# Altium footprint library IC.PcbLib: 386 footprints (part 5 of 30)
Each footprint in its own frame and in the unit in brackets; x right, y up, seen from the top. Pads: shape width x height; smd on the part's side, far side on the other; paste and mask are expansions set on the pad; w line width, h text height; cw(c..) or ccw(c..) is an arc to the next point about the centre after c.
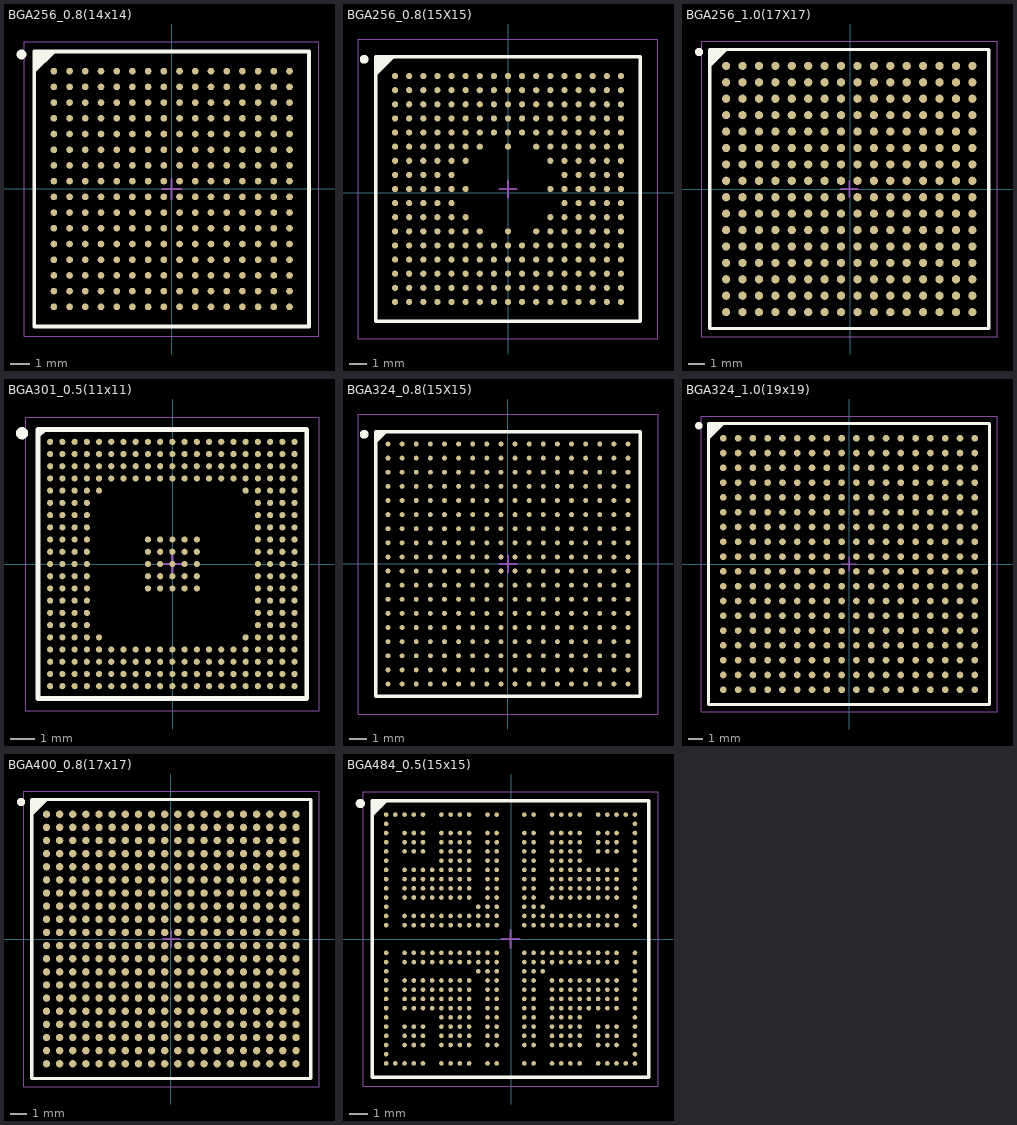
[diagram p4: the footprints below, top view; thin cyan lines are the x and y axes]

## BGA256_0.8(14x14) [mm]
pads (256):
  round 0.34 smd: A1(-6,5.975) A2(-5.2,5.975) A3(-4.4,5.975) A4(-3.6,5.975) A5(-2.8,5.975) A6(-2,5.975) A7(-1.2,5.975) A8(-0.4,5.975) A9(0.4,5.975) A10(1.2,5.975) A11(2,5.975) A12(2.8,5.975) A13(3.6,5.975) A14(4.4,5.975) A15(5.2,5.975) A16(6,5.975) B1(-6,5.175) B2(-5.2,5.175) B3(-4.4,5.175) B4(-3.6,5.175) B5(-2.8,5.175) B6(-2,5.175) B7(-1.2,5.175) B8(-0.4,5.175) B9(0.4,5.175) B10(1.2,5.175) B11(2,5.175) B12(2.8,5.175) B13(3.6,5.175) B14(4.4,5.175) B15(5.2,5.175) B16(6,5.175) C1(-6,4.375) C2(-5.2,4.375) C3(-4.4,4.375) C4(-3.6,4.375) C5(-2.8,4.375) C6(-2,4.375) C7(-1.2,4.375) C8(-0.4,4.375) C9(0.4,4.375) C10(1.2,4.375) C11(2,4.375) C12(2.8,4.375) C13(3.6,4.375) C14(4.4,4.375) C15(5.2,4.375) C16(6,4.375) D1(-6,3.575) D2(-5.2,3.575) D3(-4.4,3.575) D4(-3.6,3.575) D5(-2.8,3.575) D6(-2,3.575) D7(-1.2,3.575) D8(-0.4,3.575) D9(0.4,3.575) D10(1.2,3.575) D11(2,3.575) D12(2.8,3.575) D13(3.6,3.575) D14(4.4,3.575) D15(5.2,3.575) D16(6,3.575) E1(-6,2.775) E2(-5.2,2.775) E3(-4.4,2.775) E4(-3.6,2.775) E5(-2.8,2.775) E6(-2,2.775) E7(-1.2,2.775) E8(-0.4,2.775) E9(0.4,2.775) E10(1.2,2.775) E11(2,2.775) E12(2.8,2.775) E13(3.6,2.775) E14(4.4,2.775) E15(5.2,2.775) E16(6,2.775) F1(-6,1.975) F2(-5.2,1.975) F3(-4.4,1.975) F4(-3.6,1.975) F5(-2.8,1.975) F6(-2,1.975) F7(-1.2,1.975) F8(-0.4,1.975) F9(0.4,1.975) F10(1.2,1.975) F11(2,1.975) F12(2.8,1.975) F13(3.6,1.975) F14(4.4,1.975) F15(5.2,1.975) F16(6,1.975) G1(-6,1.175) G2(-5.2,1.175) G3(-4.4,1.175) G4(-3.6,1.175) G5(-2.8,1.175) G6(-2,1.175) G7(-1.2,1.175) G8(-0.4,1.175) G9(0.4,1.175) G10(1.2,1.175) G11(2,1.175) G12(2.8,1.175) G13(3.6,1.175) G14(4.4,1.175) G15(5.2,1.175) G16(6,1.175) H1(-6,0.375) H2(-5.2,0.375) H3(-4.4,0.375) H4(-3.6,0.375) H5(-2.8,0.375) H6(-2,0.375) H7(-1.2,0.375) H8(-0.4,0.375) H9(0.4,0.375) H10(1.2,0.375) H11(2,0.375) H12(2.8,0.375) H13(3.6,0.375) H14(4.4,0.375) H15(5.2,0.375) H16(6,0.375) J1(-6,-0.425) J2(-5.2,-0.425) J3(-4.4,-0.425) J4(-3.6,-0.425) J5(-2.8,-0.425) J6(-2,-0.425) J7(-1.2,-0.425) J8(-0.4,-0.425) J9(0.4,-0.425) J10(1.2,-0.425) J11(2,-0.425) J12(2.8,-0.425) J13(3.6,-0.425) J14(4.4,-0.425) J15(5.2,-0.425) J16(6,-0.425) K1(-6,-1.225) K2(-5.2,-1.225) K3(-4.4,-1.225) K4(-3.6,-1.225) K5(-2.8,-1.225) K6(-2,-1.225) K7(-1.2,-1.225) K8(-0.4,-1.225) K9(0.4,-1.225) K10(1.2,-1.225) K11(2,-1.225) K12(2.8,-1.225) K13(3.6,-1.225) K14(4.4,-1.225) K15(5.2,-1.225) K16(6,-1.225) L1(-6,-2.025) L2(-5.2,-2.025) L3(-4.4,-2.025) L4(-3.6,-2.025) L5(-2.8,-2.025) L6(-2,-2.025) L7(-1.2,-2.025) L8(-0.4,-2.025) L9(0.4,-2.025) L10(1.2,-2.025) L11(2,-2.025) L12(2.8,-2.025) L13(3.6,-2.025) L14(4.4,-2.025) L15(5.2,-2.025) L16(6,-2.025) M1(-6,-2.825) M2(-5.2,-2.825) M3(-4.4,-2.825) M4(-3.6,-2.825) M5(-2.8,-2.825) M6(-2,-2.825) M7(-1.2,-2.825) M8(-0.4,-2.825) M9(0.4,-2.825) M10(1.2,-2.825) M11(2,-2.825) M12(2.8,-2.825) M13(3.6,-2.825) M14(4.4,-2.825) M15(5.2,-2.825) M16(6,-2.825) N1(-6,-3.625) N2(-5.2,-3.625) N3(-4.4,-3.625) N4(-3.6,-3.625) N5(-2.8,-3.625) N6(-2,-3.625) N7(-1.2,-3.625) N8(-0.4,-3.625) N9(0.4,-3.625) N10(1.2,-3.625) N11(2,-3.625) N12(2.8,-3.625) N13(3.6,-3.625) N14(4.4,-3.625) N15(5.2,-3.625) N16(6,-3.625) P1(-6,-4.425) P2(-5.2,-4.425) P3(-4.4,-4.425) P4(-3.6,-4.425) P5(-2.8,-4.425) P6(-2,-4.425) P7(-1.2,-4.425) P8(-0.4,-4.425) P9(0.4,-4.425) P10(1.2,-4.425) P11(2,-4.425) P12(2.8,-4.425) P13(3.6,-4.425) P14(4.4,-4.425) P15(5.2,-4.425) P16(6,-4.425) R1(-6,-5.225) R2(-5.2,-5.225) R3(-4.4,-5.225) R4(-3.6,-5.225) R5(-2.8,-5.225) R6(-2,-5.225) R7(-1.2,-5.225) R8(-0.4,-5.225) R9(0.4,-5.225) R10(1.2,-5.225) R11(2,-5.225) R12(2.8,-5.225) R13(3.6,-5.225) R14(4.4,-5.225) R15(5.2,-5.225) R16(6,-5.225) T1(-6,-6.025) T2(-5.2,-6.025) T3(-4.4,-6.025) T4(-3.6,-6.025) T5(-2.8,-6.025) T6(-2,-6.025) T7(-1.2,-6.025) T8(-0.4,-6.025) T9(0.4,-6.025) T10(1.2,-6.025) T11(2,-6.025) T12(2.8,-6.025) T13(3.6,-6.025) T14(4.4,-6.025) T15(5.2,-6.025) T16(6,-6.025)
Top Overlay:
  circle w0.25: c-7.65,6.825 r0.125
  region: -6,6.975 -7,5.975 -7,6.975
  lines w0.2: -7,5.975 -6,6.975 ; -7,-7.025 -7,6.975 7,6.975 7,-7.025 -7,-7.025
Mechanical 13:
  lines w0.1: -7,-7.025 -7,6.975 7,6.975 7,-7.025 -7,-7.025
Mechanical 15:
  lines w0.05: -7.5,-7.525 -7.5,7.475 7.5,7.475 7.5,-7.525 -7.5,-7.525
  lines w0.1: -0.5,-0.025 0.5,-0.025 ; 0,-0.525 0,0.475
3D body "BGA256C80P16X16_1400X1400X150.step": height 1.5, standoff 0, extent -7,-7 7,7

## BGA256_0.8(15X15) [mm]
pads (256):
  round 0.35 smd: A1(-6.425,6.603) A2(-5.625,6.603) A3(-4.825,6.603) A4(-4.025,6.603) A5(-3.225,6.603) A6(-2.425,6.603) A7(-1.625,6.603) A8(-0.825,6.603) A9(-0.025,6.603) A10(0.775,6.603) A11(1.575,6.603) A12(2.375,6.603) A13(3.175,6.603) A14(3.975,6.603) A15(4.775,6.603) A16(5.575,6.603) A17(6.375,6.603) B1(-6.425,5.803) B2(-5.625,5.803) B3(-4.825,5.803) B4(-4.025,5.803) B5(-3.225,5.803) B6(-2.425,5.803) B7(-1.625,5.803) B8(-0.825,5.803) B9(-0.025,5.803) B10(0.775,5.803) B11(1.575,5.803) B12(2.375,5.803) B13(3.175,5.803) B14(3.975,5.803) B15(4.775,5.803) B16(5.575,5.803) B17(6.375,5.803) C1(-6.425,5.003) C2(-5.625,5.003) C3(-4.825,5.003) C4(-4.025,5.003) C5(-3.225,5.003) C6(-2.425,5.003) C7(-1.625,5.003) C8(-0.825,5.003) C9(-0.025,5.003) C10(0.775,5.003) C11(1.575,5.003) C12(2.375,5.003) C13(3.175,5.003) C14(3.975,5.003) C15(4.775,5.003) C16(5.575,5.003) C17(6.375,5.003) D1(-6.425,4.203) D2(-5.625,4.203) D3(-4.825,4.203) D4(-4.025,4.203) D5(-3.225,4.203) D6(-2.425,4.203) D7(-1.625,4.203) D8(-0.825,4.203) D9(-0.025,4.203) D10(0.775,4.203) D11(1.575,4.203) D12(2.375,4.203) D13(3.175,4.203) D14(3.975,4.203) D15(4.775,4.203) D16(5.575,4.203) D17(6.375,4.203) E1(-6.425,3.403) E2(-5.625,3.403) E3(-4.825,3.403) E4(-4.025,3.403) E5(-3.225,3.403) E6(-2.425,3.403) E7(-1.625,3.403) E8(-0.825,3.403) E9(-0.025,3.403) E10(0.775,3.403) E11(1.575,3.403) E12(2.375,3.403) E13(3.175,3.403) E14(3.975,3.403) E15(4.775,3.403) E16(5.575,3.403) E17(6.375,3.403) F1(-6.425,2.603) F2(-5.625,2.603) F3(-4.825,2.603) F4(-4.025,2.603) F5(-3.225,2.603) F6(-2.425,2.603) F7(-1.625,2.603) F9(-0.025,2.603) F11(1.575,2.603) F12(2.375,2.603) F13(3.175,2.603) F14(3.975,2.603) F15(4.775,2.603) F16(5.575,2.603) F17(6.375,2.603) G1(-6.425,1.803) G2(-5.625,1.803) G3(-4.825,1.803) G4(-4.025,1.803) G5(-3.225,1.803) G6(-2.425,1.803) G12(2.375,1.803) G13(3.175,1.803) G14(3.975,1.803) G15(4.775,1.803) G16(5.575,1.803) G17(6.375,1.803) H1(-6.425,1.003) H2(-5.625,1.003) H3(-4.825,1.003) H4(-4.025,1.003) H5(-3.225,1.003) H13(3.175,1.003) H14(3.975,1.003) H15(4.775,1.003) H16(5.575,1.003) H17(6.375,1.003) J1(-6.425,0.203) J2(-5.625,0.203) J3(-4.825,0.203) J4(-4.025,0.203) J5(-3.225,0.203) J6(-2.425,0.203) J12(2.375,0.203) J13(3.175,0.203) J14(3.975,0.203) J15(4.775,0.203) J16(5.575,0.203) J17(6.375,0.203) K1(-6.425,-0.597) K2(-5.625,-0.597) K3(-4.825,-0.597) K4(-4.025,-0.597) K5(-3.225,-0.597) K13(3.175,-0.597) K14(3.975,-0.597) K15(4.775,-0.597) K16(5.575,-0.597) K17(6.375,-0.597) L1(-6.425,-1.397) L2(-5.625,-1.397) L3(-4.825,-1.397) L4(-4.025,-1.397) L5(-3.225,-1.397) L6(-2.425,-1.397) L12(2.375,-1.397) L13(3.175,-1.397) L14(3.975,-1.397) L15(4.775,-1.397) L16(5.575,-1.397) L17(6.375,-1.397) M1(-6.425,-2.197) M2(-5.625,-2.197) M3(-4.825,-2.197) M4(-4.025,-2.197) M5(-3.225,-2.197) M6(-2.425,-2.197) M7(-1.625,-2.197) M9(-0.025,-2.197) M11(1.575,-2.197) M12(2.375,-2.197) M13(3.175,-2.197) M14(3.975,-2.197) M15(4.775,-2.197) M16(5.575,-2.197) M17(6.375,-2.197) N1(-6.425,-2.997) N2(-5.625,-2.997) N3(-4.825,-2.997) N4(-4.025,-2.997) N5(-3.225,-2.997) N6(-2.425,-2.997) N7(-1.625,-2.997) N8(-0.825,-2.997) N9(-0.025,-2.997) N10(0.775,-2.997) N11(1.575,-2.997) N12(2.375,-2.997) N13(3.175,-2.997) N14(3.975,-2.997) N15(4.775,-2.997) N16(5.575,-2.997) N17(6.375,-2.997) P1(-6.425,-3.797) P2(-5.625,-3.797) P3(-4.825,-3.797) P4(-4.025,-3.797) P5(-3.225,-3.797) P6(-2.425,-3.797) P7(-1.625,-3.797) P8(-0.825,-3.797) P9(-0.025,-3.797) P10(0.775,-3.797) P11(1.575,-3.797) P12(2.375,-3.797) P13(3.175,-3.797) P14(3.975,-3.797) P15(4.775,-3.797) P16(5.575,-3.797) P17(6.375,-3.797) R1(-6.425,-4.597) R2(-5.625,-4.597) R3(-4.825,-4.597) R4(-4.025,-4.597) R5(-3.225,-4.597) R6(-2.425,-4.597) R7(-1.625,-4.597) R8(-0.825,-4.597) R9(-0.025,-4.597) R10(0.775,-4.597) R11(1.575,-4.597) R12(2.375,-4.597) R13(3.175,-4.597) R14(3.975,-4.597) R15(4.775,-4.597) R16(5.575,-4.597) R17(6.375,-4.597) T1(-6.425,-5.397) T2(-5.625,-5.397) T3(-4.825,-5.397) T4(-4.025,-5.397) T5(-3.225,-5.397) T6(-2.425,-5.397) T7(-1.625,-5.397) T8(-0.825,-5.397) T9(-0.025,-5.397) T10(0.775,-5.397) T11(1.575,-5.397) T12(2.375,-5.397) T13(3.175,-5.397) T14(3.975,-5.397) T15(4.775,-5.397) T16(5.575,-5.397) T17(6.375,-5.397) U1(-6.425,-6.197) U2(-5.625,-6.197) U3(-4.825,-6.197) U4(-4.025,-6.197) U5(-3.225,-6.197) U6(-2.425,-6.197) U7(-1.625,-6.197) U8(-0.825,-6.197) U9(-0.025,-6.197) U10(0.775,-6.197) U11(1.575,-6.197) U12(2.375,-6.197) U13(3.175,-6.197) U14(3.975,-6.197) U15(4.775,-6.197) U16(5.575,-6.197) U17(6.375,-6.197)
Top Overlay:
  circle w0.25: c-8.175,7.553 r0.125
  region: -6.525,7.703 -7.525,6.703 -7.525,7.703
  lines w0.2: -7.525,6.703 -6.525,7.703 ; -7.525,-7.297 7.475,-7.297 7.475,7.703 -7.525,7.703 -7.525,-7.297
Mechanical 13:
  lines w0.1: -7.525,-7.297 7.475,-7.297 7.475,7.703 -7.525,7.703 -7.525,-7.297
Mechanical 15:
  lines w0.05: -8.525,-8.297 8.475,-8.297 8.475,8.703 -8.525,8.703 -8.525,-8.297
  lines w0.1: -0.525,0.203 0.475,0.203 ; -0.025,-0.297 -0.025,0.703
3D body: height 1.4, standoff 0.4, extent -6.645,6.307 -5.848,7.105
3D body: height 1.25, standoff 0, extent -7.525,-7.297 7.475,7.703

## BGA256_1.0(17X17) [mm]
pads (256):
  round 0.5 smd: A1(-7.551,7.525) A2(-6.551,7.525) A3(-5.551,7.525) A4(-4.551,7.525) A5(-3.551,7.525) A6(-2.551,7.525) A7(-1.551,7.525) A8(-0.551,7.525) A9(0.449,7.525) A10(1.449,7.525) A11(2.449,7.525) A12(3.449,7.525) A13(4.449,7.525) A14(5.449,7.525) A15(6.449,7.525) A16(7.449,7.525) B1(-7.551,6.525) B2(-6.551,6.525) B3(-5.551,6.525) B4(-4.551,6.525) B5(-3.551,6.525) B6(-2.551,6.525) B7(-1.551,6.525) B8(-0.551,6.525) B9(0.449,6.525) B10(1.449,6.525) B11(2.449,6.525) B12(3.449,6.525) B13(4.449,6.525) B14(5.449,6.525) B15(6.449,6.525) B16(7.449,6.525) C1(-7.551,5.525) C2(-6.551,5.525) C3(-5.551,5.525) C4(-4.551,5.525) C5(-3.551,5.525) C6(-2.551,5.525) C7(-1.551,5.525) C8(-0.551,5.525) C9(0.449,5.525) C10(1.449,5.525) C11(2.449,5.525) C12(3.449,5.525) C13(4.449,5.525) C14(5.449,5.525) C15(6.449,5.525) C16(7.449,5.525) D1(-7.551,4.525) D2(-6.551,4.525) D3(-5.551,4.525) D4(-4.551,4.525) D5(-3.551,4.525) D6(-2.551,4.525) D7(-1.551,4.525) D8(-0.551,4.525) D9(0.449,4.525) D10(1.449,4.525) D11(2.449,4.525) D12(3.449,4.525) D13(4.449,4.525) D14(5.449,4.525) D15(6.449,4.525) D16(7.449,4.525) E1(-7.551,3.525) E2(-6.551,3.525) E3(-5.551,3.525) E4(-4.551,3.525) E5(-3.551,3.525) E6(-2.551,3.525) E7(-1.551,3.525) E8(-0.551,3.525) E9(0.449,3.525) E10(1.449,3.525) E11(2.449,3.525) E12(3.449,3.525) E13(4.449,3.525) E14(5.449,3.525) E15(6.449,3.525) E16(7.449,3.525) F1(-7.551,2.525) F2(-6.551,2.525) F3(-5.551,2.525) F4(-4.551,2.525) F5(-3.551,2.525) F6(-2.551,2.525) F7(-1.551,2.525) F8(-0.551,2.525) F9(0.449,2.525) F10(1.449,2.525) F11(2.449,2.525) F12(3.449,2.525) F13(4.449,2.525) F14(5.449,2.525) F15(6.449,2.525) F16(7.449,2.525) G1(-7.551,1.525) G2(-6.551,1.525) G3(-5.551,1.525) G4(-4.551,1.525) G5(-3.551,1.525) G6(-2.551,1.525) G7(-1.551,1.525) G8(-0.551,1.525) G9(0.449,1.525) G10(1.449,1.525) G11(2.449,1.525) G12(3.449,1.525) G13(4.449,1.525) G14(5.449,1.525) G15(6.449,1.525) G16(7.449,1.525) H1(-7.551,0.525) H2(-6.551,0.525) H3(-5.551,0.525) H4(-4.551,0.525) H5(-3.551,0.525) H6(-2.551,0.525) H7(-1.551,0.525) H8(-0.551,0.525) H9(0.449,0.525) H10(1.449,0.525) H11(2.449,0.525) H12(3.449,0.525) H13(4.449,0.525) H14(5.449,0.525) H15(6.449,0.525) H16(7.449,0.525) J1(-7.551,-0.475) J2(-6.551,-0.475) J3(-5.551,-0.475) J4(-4.551,-0.475) J5(-3.551,-0.475) J6(-2.551,-0.475) J7(-1.551,-0.475) J8(-0.551,-0.475) J9(0.449,-0.475) J10(1.449,-0.475) J11(2.449,-0.475) J12(3.449,-0.475) J13(4.449,-0.475) J14(5.449,-0.475) J15(6.449,-0.475) J16(7.449,-0.475) K1(-7.551,-1.475) K2(-6.551,-1.475) K3(-5.551,-1.475) K4(-4.551,-1.475) K5(-3.551,-1.475) K6(-2.551,-1.475) K7(-1.551,-1.475) K8(-0.551,-1.475) K9(0.449,-1.475) K10(1.449,-1.475) K11(2.449,-1.475) K12(3.449,-1.475) K13(4.449,-1.475) K14(5.449,-1.475) K15(6.449,-1.475) K16(7.449,-1.475) L1(-7.551,-2.475) L2(-6.551,-2.475) L3(-5.551,-2.475) L4(-4.551,-2.475) L5(-3.551,-2.475) L6(-2.551,-2.475) L7(-1.551,-2.475) L8(-0.551,-2.475) L9(0.449,-2.475) L10(1.449,-2.475) L11(2.449,-2.475) L12(3.449,-2.475) L13(4.449,-2.475) L14(5.449,-2.475) L15(6.449,-2.475) L16(7.449,-2.475) M1(-7.551,-3.475) M2(-6.551,-3.475) M3(-5.551,-3.475) M4(-4.551,-3.475) M5(-3.551,-3.475) M6(-2.551,-3.475) M7(-1.551,-3.475) M8(-0.551,-3.475) M9(0.449,-3.475) M10(1.449,-3.475) M11(2.449,-3.475) M12(3.449,-3.475) M13(4.449,-3.475) M14(5.449,-3.475) M15(6.449,-3.475) M16(7.449,-3.475) N1(-7.551,-4.475) N2(-6.551,-4.475) N3(-5.551,-4.475) N4(-4.551,-4.475) N5(-3.551,-4.475) N6(-2.551,-4.475) N7(-1.551,-4.475) N8(-0.551,-4.475) N9(0.449,-4.475) N10(1.449,-4.475) N11(2.449,-4.475) N12(3.449,-4.475) N13(4.449,-4.475) N14(5.449,-4.475) N15(6.449,-4.475) N16(7.449,-4.475) P1(-7.551,-5.475) P2(-6.551,-5.475) P3(-5.551,-5.475) P4(-4.551,-5.475) P5(-3.551,-5.475) P6(-2.551,-5.475) P7(-1.551,-5.475) P8(-0.551,-5.475) P9(0.449,-5.475) P10(1.449,-5.475) P11(2.449,-5.475) P12(3.449,-5.475) P13(4.449,-5.475) P14(5.449,-5.475) P15(6.449,-5.475) P16(7.449,-5.475) R1(-7.551,-6.475) R2(-6.551,-6.475) R3(-5.551,-6.475) R4(-4.551,-6.475) R5(-3.551,-6.475) R6(-2.551,-6.475) R7(-1.551,-6.475) R8(-0.551,-6.475) R9(0.449,-6.475) R10(1.449,-6.475) R11(2.449,-6.475) R12(3.449,-6.475) R13(4.449,-6.475) R14(5.449,-6.475) R15(6.449,-6.475) R16(7.449,-6.475) T1(-7.551,-7.475) T2(-6.551,-7.475) T3(-5.551,-7.475) T4(-4.551,-7.475) T5(-3.551,-7.475) T6(-2.551,-7.475) T7(-1.551,-7.475) T8(-0.551,-7.475) T9(0.449,-7.475) T10(1.449,-7.475) T11(2.449,-7.475) T12(3.449,-7.475) T13(4.449,-7.475) T14(5.449,-7.475) T15(6.449,-7.475) T16(7.449,-7.475)
Top Overlay:
  circle w0.25: c-9.201,8.375 r0.125
  region: -7.551,8.525 -8.551,7.525 -8.551,8.525
  lines w0.2: -8.551,7.525 -7.551,8.525 ; -8.551,-8.475 8.449,-8.475 8.449,8.525 -8.551,8.525 -8.551,-8.475
Mechanical 13:
  lines w0.1: -8.551,-8.475 8.449,-8.475 8.449,8.525 -8.551,8.525 -8.551,-8.475
Mechanical 15:
  lines w0.05: -9.051,-8.975 -9.051,9.025 8.949,9.025 8.949,-8.975 -9.051,-8.975
  lines w0.1: -0.551,0.025 0.449,0.025 ; -0.051,-0.475 -0.051,0.525
3D body "User Library-BGA 256 17x17mm 1mm pitch.step": height 1.85, standoff 0.1, extent -8.551,-8.474 8.449,8.526

## BGA301_0.5(11x11) [mm]
pads (301):
  round 0.25 smd: A1(-5.025,5) A2(-4.525,5) A3(-4.025,5) A4(-3.525,5) A5(-3.025,5) A6(-2.525,5) A7(-2.025,5) A8(-1.525,5) A9(-1.025,5) A10(-0.525,5) A11(-0.025,5) A12(0.475,5) A13(0.975,5) A14(1.475,5) A15(1.975,5) A16(2.475,5) A17(2.975,5) A18(3.475,5) A19(3.975,5) A20(4.475,5) A21(4.975,5) AA1(-5.025,-5) AA2(-4.525,-5) AA3(-4.025,-5) AA4(-3.525,-5) AA5(-3.025,-5) AA6(-2.525,-5) AA7(-2.025,-5) AA8(-1.525,-5) AA9(-1.025,-5) AA10(-0.525,-5) AA11(-0.025,-5) AA12(0.475,-5) AA13(0.975,-5) AA14(1.475,-5) AA15(1.975,-5) AA16(2.475,-5) AA17(2.975,-5) AA18(3.475,-5) AA19(3.975,-5) AA20(4.475,-5) AA21(4.975,-5) B1(-5.025,4.5) B2(-4.525,4.5) B3(-4.025,4.5) B4(-3.525,4.5) B5(-3.025,4.5) B6(-2.525,4.5) B7(-2.025,4.5) B8(-1.525,4.5) B9(-1.025,4.5) B10(-0.525,4.5) B11(-0.025,4.5) B12(0.475,4.5) B13(0.975,4.5) B14(1.475,4.5) B15(1.975,4.5) B16(2.475,4.5) B17(2.975,4.5) B18(3.475,4.5) B19(3.975,4.5) B20(4.475,4.5) B21(4.975,4.5) C1(-5.025,4) C2(-4.525,4) C3(-4.025,4) C4(-3.525,4) C5(-3.025,4) C6(-2.525,4) C7(-2.025,4) C8(-1.525,4) C9(-1.025,4) C10(-0.525,4) C11(-0.025,4) C12(0.475,4) C13(0.975,4) C14(1.475,4) C15(1.975,4) C16(2.475,4) C17(2.975,4) C18(3.475,4) C19(3.975,4) C20(4.475,4) C21(4.975,4) D1(-5.025,3.5) D2(-4.525,3.5) D3(-4.025,3.5) D4(-3.525,3.5) D5(-3.025,3.5) D6(-2.525,3.5) D7(-2.025,3.5) D8(-1.525,3.5) D9(-1.025,3.5) D10(-0.525,3.5) D11(-0.025,3.5) D12(0.475,3.5) D13(0.975,3.5) D14(1.475,3.5) D15(1.975,3.5) D16(2.475,3.5) D17(2.975,3.5) D18(3.475,3.5) D19(3.975,3.5) D20(4.475,3.5) D21(4.975,3.5) E1(-5.025,3) E2(-4.525,3) E3(-4.025,3) E4(-3.525,3) E5(-3.025,3) E17(2.975,3) E18(3.475,3) E19(3.975,3) E20(4.475,3) E21(4.975,3) F1(-5.025,2.5) F2(-4.525,2.5) F3(-4.025,2.5) F4(-3.525,2.5) F18(3.475,2.5) F19(3.975,2.5) F20(4.475,2.5) F21(4.975,2.5) G1(-5.025,2) G2(-4.525,2) G3(-4.025,2) G4(-3.525,2) G18(3.475,2) G19(3.975,2) G20(4.475,2) G21(4.975,2) H1(-5.025,1.5) H2(-4.525,1.5) H3(-4.025,1.5) H4(-3.525,1.5) H18(3.475,1.5) H19(3.975,1.5) H20(4.475,1.5) H21(4.975,1.5) J1(-5.025,1) J2(-4.525,1) J3(-4.025,1) J4(-3.525,1) J9(-1.025,1) J10(-0.525,1) J11(-0.025,1) J12(0.475,1) J13(0.975,1) J18(3.475,1) J19(3.975,1) J20(4.475,1) J21(4.975,1) K1(-5.025,0.5) K2(-4.525,0.5) K3(-4.025,0.5) K4(-3.525,0.5) K9(-1.025,0.5) K10(-0.525,0.5) K11(-0.025,0.5) K12(0.475,0.5) K13(0.975,0.5) K18(3.475,0.5) K19(3.975,0.5) K20(4.475,0.5) K21(4.975,0.5) L1(-5.025,0) L2(-4.525,0) L3(-4.025,0) L4(-3.525,0) L9(-1.025,0) L10(-0.525,0) L11(-0.025,0) L12(0.475,0) L13(0.975,0) L18(3.475,0) L19(3.975,0) L20(4.475,0) L21(4.975,0) M1(-5.025,-0.5) M2(-4.525,-0.5) M3(-4.025,-0.5) M4(-3.525,-0.5) M9(-1.025,-0.5) M10(-0.525,-0.5) M11(-0.025,-0.5) M12(0.475,-0.5) M13(0.975,-0.5) M18(3.475,-0.5) M19(3.975,-0.5) M20(4.475,-0.5) M21(4.975,-0.5) N1(-5.025,-1) N2(-4.525,-1) N3(-4.025,-1) N4(-3.525,-1) N9(-1.025,-1) N10(-0.525,-1) N11(-0.025,-1) N12(0.475,-1) N13(0.975,-1) N18(3.475,-1) N19(3.975,-1) N20(4.475,-1) N21(4.975,-1) P1(-5.025,-1.5) P2(-4.525,-1.5) P3(-4.025,-1.5) P4(-3.525,-1.5) P18(3.475,-1.5) P19(3.975,-1.5) P20(4.475,-1.5) P21(4.975,-1.5) R1(-5.025,-2) R2(-4.525,-2) R3(-4.025,-2) R4(-3.525,-2) R18(3.475,-2) R19(3.975,-2) R20(4.475,-2) R21(4.975,-2) T1(-5.025,-2.5) T2(-4.525,-2.5) T3(-4.025,-2.5) T4(-3.525,-2.5) T18(3.475,-2.5) T19(3.975,-2.5) T20(4.475,-2.5) T21(4.975,-2.5) U1(-5.025,-3) U2(-4.525,-3) U3(-4.025,-3) U4(-3.525,-3) U5(-3.025,-3) U17(2.975,-3) U18(3.475,-3) U19(3.975,-3) U20(4.475,-3) U21(4.975,-3) V1(-5.025,-3.5) V2(-4.525,-3.5) V3(-4.025,-3.5) V4(-3.525,-3.5) V5(-3.025,-3.5) V6(-2.525,-3.5) V7(-2.025,-3.5) V8(-1.525,-3.5) V9(-1.025,-3.5) V10(-0.525,-3.5) V11(-0.025,-3.5) V12(0.475,-3.5) V13(0.975,-3.5) V14(1.475,-3.5) V15(1.975,-3.5) V16(2.475,-3.5) V17(2.975,-3.5) V18(3.475,-3.5) V19(3.975,-3.5) V20(4.475,-3.5) V21(4.975,-3.5) W1(-5.025,-4) W2(-4.525,-4) W3(-4.025,-4) W4(-3.525,-4) W5(-3.025,-4) W6(-2.525,-4) W7(-2.025,-4) W8(-1.525,-4) W9(-1.025,-4) W10(-0.525,-4) W11(-0.025,-4) W12(0.475,-4) W13(0.975,-4) W14(1.475,-4) W15(1.975,-4) W16(2.475,-4) W17(2.975,-4) W18(3.475,-4) W19(3.975,-4) W20(4.475,-4) W21(4.975,-4) Y1(-5.025,-4.5) Y2(-4.525,-4.5) Y3(-4.025,-4.5) Y4(-3.525,-4.5) Y5(-3.025,-4.5) Y6(-2.525,-4.5) Y7(-2.025,-4.5) Y8(-1.525,-4.5) Y9(-1.025,-4.5) Y10(-0.525,-4.5) Y11(-0.025,-4.5) Y12(0.475,-4.5) Y13(0.975,-4.5) Y14(1.475,-4.5) Y15(1.975,-4.5) Y16(2.475,-4.5) Y17(2.975,-4.5) Y18(3.475,-4.5) Y19(3.975,-4.5) Y20(4.475,-4.5) Y21(4.975,-4.5)
Top Overlay:
  circle w0.25: c-6.175,5.35 r0.125
  region: -5.268,5.5 -5.525,5.242 -5.525,5.5
  lines w0.2: -5.525,5.242 -5.268,5.5 ; -5.525,-5.5 -5.525,5.5 5.475,5.5 5.475,-5.5 -5.525,-5.5
Mechanical 13:
  lines w0.1: -5.525,-5.5 -5.525,5.5 5.475,5.5 5.475,-5.5 -5.525,-5.5
Mechanical 15:
  lines w0.05: -6.025,-6 -6.025,6 5.975,6 5.975,-6 -6.025,-6
  lines w0.1: -0.525,0 0.475,0 ; -0.025,-0.5 -0.025,0.5
3D body: height 0.95, standoff 0.16, extent -5.525,-5.5 5.475,5.5
3D body: height 1.05, standoff 0.4, extent -4.994,4.147 -4.197,4.946

## BGA324_0.8(15X15) [mm] "BGA, 324-Leads, Body 15x15mm, Pitch 0.8mm"
height 1.2
pads (324):
  round 0.28 smd: A1(-6.8,6.8) A2(-6,6.8) A3(-5.2,6.8) A4(-4.4,6.8) A5(-3.6,6.8) A6(-2.8,6.8) A7(-2,6.8) A8(-1.2,6.8) A9(-0.4,6.8) A10(0.4,6.8) A11(1.2,6.8) A12(2,6.8) A13(2.8,6.8) A14(3.6,6.8) A15(4.4,6.8) A16(5.2,6.8) A17(6,6.8) A18(6.8,6.8) B1(-6.8,6) B2(-6,6) B3(-5.2,6) B4(-4.4,6) B5(-3.6,6) B6(-2.8,6) B7(-2,6) B8(-1.2,6) B9(-0.4,6) B10(0.4,6) B11(1.2,6) B12(2,6) B13(2.8,6) B14(3.6,6) B15(4.4,6) B16(5.2,6) B17(6,6) B18(6.8,6) C1(-6.8,5.2) C2(-6,5.2) C3(-5.2,5.2) C4(-4.4,5.2) C5(-3.6,5.2) C6(-2.8,5.2) C7(-2,5.2) C8(-1.2,5.2) C9(-0.4,5.2) C10(0.4,5.2) C11(1.2,5.2) C12(2,5.2) C13(2.8,5.2) C14(3.6,5.2) C15(4.4,5.2) C16(5.2,5.2) C17(6,5.2) C18(6.8,5.2) D1(-6.8,4.4) D2(-6,4.4) D3(-5.2,4.4) D4(-4.4,4.4) D5(-3.6,4.4) D6(-2.8,4.4) D7(-2,4.4) D8(-1.2,4.4) D9(-0.4,4.4) D10(0.4,4.4) D11(1.2,4.4) D12(2,4.4) D13(2.8,4.4) D14(3.6,4.4) D15(4.4,4.4) D16(5.2,4.4) D17(6,4.4) D18(6.8,4.4) E1(-6.8,3.6) E2(-6,3.6) E3(-5.2,3.6) E4(-4.4,3.6) E5(-3.6,3.6) E6(-2.8,3.6) E7(-2,3.6) E8(-1.2,3.6) E9(-0.4,3.6) E10(0.4,3.6) E11(1.2,3.6) E12(2,3.6) E13(2.8,3.6) E14(3.6,3.6) E15(4.4,3.6) E16(5.2,3.6) E17(6,3.6) E18(6.8,3.6) F1(-6.8,2.8) F2(-6,2.8) F3(-5.2,2.8) F4(-4.4,2.8) F5(-3.6,2.8) F6(-2.8,2.8) F7(-2,2.8) F8(-1.2,2.8) F9(-0.4,2.8) F10(0.4,2.8) F11(1.2,2.8) F12(2,2.8) F13(2.8,2.8) F14(3.6,2.8) F15(4.4,2.8) F16(5.2,2.8) F17(6,2.8) F18(6.8,2.8) G1(-6.8,2) G2(-6,2) G3(-5.2,2) G4(-4.4,2) G5(-3.6,2) G6(-2.8,2) G7(-2,2) G8(-1.2,2) G9(-0.4,2) G10(0.4,2) G11(1.2,2) G12(2,2) G13(2.8,2) G14(3.6,2) G15(4.4,2) G16(5.2,2) G17(6,2) G18(6.8,2) H1(-6.8,1.2) H2(-6,1.2) H3(-5.2,1.2) H4(-4.4,1.2) H5(-3.6,1.2) H6(-2.8,1.2) H7(-2,1.2) H8(-1.2,1.2) H9(-0.4,1.2) H10(0.4,1.2) H11(1.2,1.2) H12(2,1.2) H13(2.8,1.2) H14(3.6,1.2) H15(4.4,1.2) H16(5.2,1.2) H17(6,1.2) H18(6.8,1.2) J1(-6.8,0.4) J2(-6,0.4) J3(-5.2,0.4) J4(-4.4,0.4) J5(-3.6,0.4) J6(-2.8,0.4) J7(-2,0.4) J8(-1.2,0.4) J9(-0.4,0.4) J10(0.4,0.4) J11(1.2,0.4) J12(2,0.4) J13(2.8,0.4) J14(3.6,0.4) J15(4.4,0.4) J16(5.2,0.4) J17(6,0.4) J18(6.8,0.4) K1(-6.8,-0.4) K2(-6,-0.4) K3(-5.2,-0.4) K4(-4.4,-0.4) K5(-3.6,-0.4) K6(-2.8,-0.4) K7(-2,-0.4) K8(-1.2,-0.4) K9(-0.4,-0.4) K10(0.4,-0.4) K11(1.2,-0.4) K12(2,-0.4) K13(2.8,-0.4) K14(3.6,-0.4) K15(4.4,-0.4) K16(5.2,-0.4) K17(6,-0.4) K18(6.8,-0.4) L1(-6.8,-1.2) L2(-6,-1.2) L3(-5.2,-1.2) L4(-4.4,-1.2) L5(-3.6,-1.2) L6(-2.8,-1.2) L7(-2,-1.2) L8(-1.2,-1.2) L9(-0.4,-1.2) L10(0.4,-1.2) L11(1.2,-1.2) L12(2,-1.2) L13(2.8,-1.2) L14(3.6,-1.2) L15(4.4,-1.2) L16(5.2,-1.2) L17(6,-1.2) L18(6.8,-1.2) M1(-6.8,-2) M2(-6,-2) M3(-5.2,-2) M4(-4.4,-2) M5(-3.6,-2) M6(-2.8,-2) M7(-2,-2) M8(-1.2,-2) M9(-0.4,-2) M10(0.4,-2) M11(1.2,-2) M12(2,-2) M13(2.8,-2) M14(3.6,-2) M15(4.4,-2) M16(5.2,-2) M17(6,-2) M18(6.8,-2) N1(-6.8,-2.8) N2(-6,-2.8) N3(-5.2,-2.8) N4(-4.4,-2.8) N5(-3.6,-2.8) N6(-2.8,-2.8) N7(-2,-2.8) N8(-1.2,-2.8) N9(-0.4,-2.8) N10(0.4,-2.8) N11(1.2,-2.8) N12(2,-2.8) N13(2.8,-2.8) N14(3.6,-2.8) N15(4.4,-2.8) N16(5.2,-2.8) N17(6,-2.8) N18(6.8,-2.8) P1(-6.8,-3.6) P2(-6,-3.6) P3(-5.2,-3.6) P4(-4.4,-3.6) P5(-3.6,-3.6) P6(-2.8,-3.6) P7(-2,-3.6) P8(-1.2,-3.6) P9(-0.4,-3.6) P10(0.4,-3.6) P11(1.2,-3.6) P12(2,-3.6) P13(2.8,-3.6) P14(3.6,-3.6) P15(4.4,-3.6) P16(5.2,-3.6) P17(6,-3.6) P18(6.8,-3.6) R1(-6.8,-4.4) R2(-6,-4.4) R3(-5.2,-4.4) R4(-4.4,-4.4) R5(-3.6,-4.4) R6(-2.8,-4.4) R7(-2,-4.4) R8(-1.2,-4.4) R9(-0.4,-4.4) R10(0.4,-4.4) R11(1.2,-4.4) R12(2,-4.4) R13(2.8,-4.4) R14(3.6,-4.4) R15(4.4,-4.4) R16(5.2,-4.4) R17(6,-4.4) R18(6.8,-4.4) T1(-6.8,-5.2) T2(-6,-5.2) T3(-5.2,-5.2) T4(-4.4,-5.2) T5(-3.6,-5.2) T6(-2.8,-5.2) T7(-2,-5.2) T8(-1.2,-5.2) T9(-0.4,-5.2) T10(0.4,-5.2) T11(1.2,-5.2) T12(2,-5.2) T13(2.8,-5.2) T14(3.6,-5.2) T15(4.4,-5.2) T16(5.2,-5.2) T17(6,-5.2) T18(6.8,-5.2) U1(-6.8,-6) U2(-6,-6) U3(-5.2,-6) U4(-4.4,-6) U5(-3.6,-6) U6(-2.8,-6) U7(-2,-6) U8(-1.2,-6) U9(-0.4,-6) U10(0.4,-6) U11(1.2,-6) U12(2,-6) U13(2.8,-6) U14(3.6,-6) U15(4.4,-6) U16(5.2,-6) U17(6,-6) U18(6.8,-6) V1(-6.8,-6.8) V2(-6,-6.8) V3(-5.2,-6.8) V4(-4.4,-6.8) V5(-3.6,-6.8) V6(-2.8,-6.8) V7(-2,-6.8) V8(-1.2,-6.8) V9(-0.4,-6.8) V10(0.4,-6.8) V11(1.2,-6.8) V12(2,-6.8) V13(2.8,-6.8) V14(3.6,-6.8) V15(4.4,-6.8) V16(5.2,-6.8) V17(6,-6.8) V18(6.8,-6.8)